# Altium footprint library Minh_Lib.PcbLib: 141 footprints (part 6 of 9)
Each footprint in its own frame and in the unit in brackets; x right, y up, seen from the top. Pads: shape width x height; smd on the part's side, far side on the other; paste and mask are expansions set on the pad; w line width, h text height; cw(c..) or ccw(c..) is an arc to the next point about the centre after c.
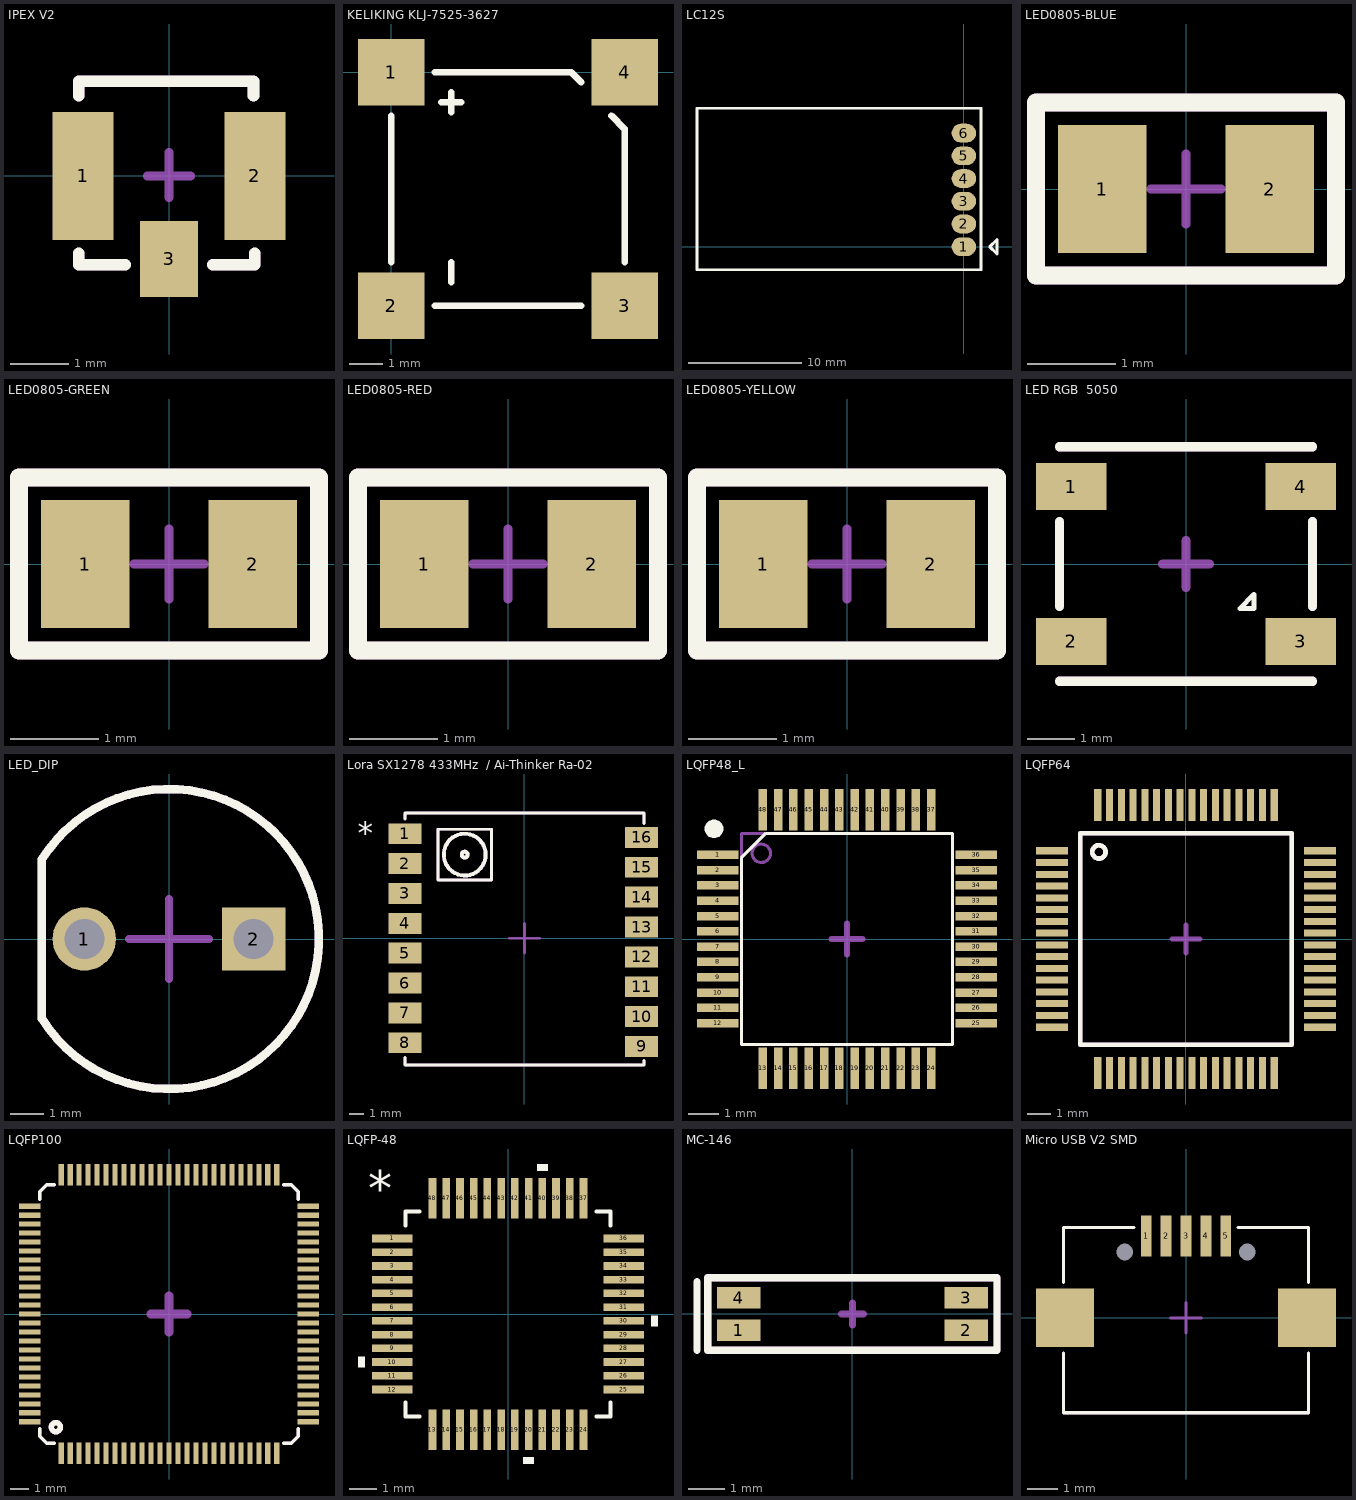
[diagram p5: the footprints below, top view; thin cyan lines are the x and y axes]

## IPEX V2 [mm]
pads (3):
  rect 1.05x2.2 smd: 1(-1.475,0) 2(1.475,0)
  rect 1x1.3 smd: 3(0,-1.425)
Top Overlay:
  lines w0.2: -1.55,-1.325 -1.55,-1.525 -0.75,-1.525 ; -1.55,1.375 -1.55,1.625 1.45,1.625 1.45,1.375 ; 0.75,-1.525 1.475,-1.525 1.475,-1.325
Mechanical 13:
  lines w0.2: -1.55,-1.325 -1.55,-1.525 -0.75,-1.525 ; -1.55,1.375 -1.55,1.625 1.45,1.625 1.45,1.375 ; 0.75,-1.525 1.475,-1.525 1.475,-1.325
  text "'.Designator'" at -1.9,-0.733 h0.5
Mechanical 15:
  lines w0.15: -0.375,0 0.025,0 ; -0.025,0 0.375,0 ; 0,-0.375 0,0.025 ; 0,0 0,0.4
3D body "User Library-IPEX.STEP": height 1.25, standoff -0.01, extent -1.525,-1.525 1.475,1.575

## KELIKING KLJ-7525-3627 [mm] "Buzzer SMD - 7.5x7.5x2.5mm 2700Hz 85dB"
pads (4):
  rect 2x2 smd: 1(0,0) 2(0,-7) 3(7,-7) 4(7,0)
Top Overlay:
  lines w0.2: 0,-5.7 0,-1.3 ; 1.3,-7 5.7,-7 ; 1.3,0 5.3,0 5.4,0 5.7,-0.3 ; 1.5,-0.9 1.8,-0.9 ; 1.8,-6.3 1.8,-6 1.8,-5.7 ; 1.8,-1.2 1.8,-0.9 ; 1.8,-0.6 1.8,-0.9 ; 2.1,-0.9 1.8,-0.9 ; 6.6,-1.3 7,-1.7 ; 7,-5.7 7,-1.7 ; 7,-1.7 7,-1.7
3D body "Buzzer KELIKING KLJ-7525-3627.STEP": height 2.65, standoff 0.05, extent -0.25,-7.25 7.25,0.25

## LC12S [mil]
pads (6):
  oval 85x65 smd: 1(0,0) 2(0,78.74) 3(0,157.48) 4(0,236.22) 5(0,314.96) 6(0,393.7)
Top Overlay:
  lines w10: -925,-80 60,-80 60,480 -925,480 -925,-80 ; 90,0 115,-25 115,25 90,0
3D body "LC12S.STEP": height 78.74, standoff 0, extent -912.32,-69.69 5,469.69

## LED0805-BLUE [mm]
pads (2):
  rect 1x1.45 smd: 1(-0.95,0) 2(0.95,0)
Top Overlay:
  lines w0.2: -1.7,-0.98 1.7,-0.98 1.7,0.98 -1.7,0.98 -1.7,-0.98
Mechanical 13:
  lines w0.2: -1.7,-0.98 1.7,-0.98 1.7,0.98 -1.7,0.98 -1.7,-0.98
  text "'.Designator'" at -1.59,-0.647 h0.7
Mechanical 15:
  lines w0.1: -0.4,0 0.4,0 ; 0,-0.4 0,0.4
3D body "SMD_0805LED_BLU.STEP": height 1.1, standoff 0, extent -1.01,-0.625 1.01,0.625

## LED0805-GREEN [mm]
pads (2):
  rect 1x1.45 smd: 1(-0.95,0) 2(0.95,0)
Top Overlay:
  lines w0.2: -1.7,-0.98 1.7,-0.98 1.7,0.98 -1.7,0.98 -1.7,-0.98
Mechanical 13:
  lines w0.2: -1.7,-0.98 1.7,-0.98 1.7,0.98 -1.7,0.98 -1.7,-0.98
  text "'.Designator'" at -1.59,-0.647 h0.7
Mechanical 15:
  lines w0.1: -0.4,0 0.4,0 ; 0,-0.4 0,0.4
3D body "SMD_0805LED_GREEN.STEP": height 1.1, standoff 0, extent -1.01,-0.625 1.01,0.625

## LED0805-RED [mm]
pads (2):
  rect 1x1.45 smd: 1(-0.95,0) 2(0.95,0)
Top Overlay:
  lines w0.2: -1.7,-0.98 -1.7,0.98 1.7,0.98 1.7,-0.98 -1.7,-0.98
Mechanical 13:
  lines w0.2: -1.7,-0.98 -1.7,0.98 1.7,0.98 1.7,-0.98 -1.7,-0.98
  text "'.Designator'" at -1.59,-0.647 h0.7
Mechanical 15:
  lines w0.1: -0.4,0 0.4,0 ; 0,-0.4 0,0.4
3D body "SMD_0805LED_RED.STEP": height 1.1, standoff 0, extent -1.01,-0.625 1.01,0.625

## LED0805-YELLOW [mm]
pads (2):
  rect 1x1.45 smd: 1(-0.95,0) 2(0.95,0)
Top Overlay:
  lines w0.2: -1.7,-0.98 -1.7,0.98 1.7,0.98 1.7,-0.98 -1.7,-0.98
Mechanical 13:
  lines w0.2: -1.7,-0.98 -1.7,0.98 1.7,0.98 1.7,-0.98 -1.7,-0.98
  text "'.Designator'" at -1.59,-0.647 h0.7
Mechanical 15:
  lines w0.1: -0.4,0 0.4,0 ; 0,-0.4 0,0.4
3D body "SMD_0805LED_YEL.STEP": height 1.1, standoff 0, extent -1.01,-0.625 1.01,0.625

## LED RGB  5050 [mm]
pads (4):
  rect 1.5x1 smd: 1(-2.45,1.65) 2(-2.45,-1.65) 3(2.45,-1.65) 4(2.45,1.65)
Top Overlay:
  lines w0.1: 1.45,-0.95 1.15,-0.95 1.45,-0.65 1.45,-0.95 ; 1.45,-0.95 1.45,-0.95
  lines w0.2: -2.7,-2.5 2.7,-2.5 ; -2.7,-0.9 -2.7,0.9 ; -2.7,2.5 2.7,2.5 ; 2.7,-0.9 2.7,0.9
Mechanical 13:
  lines w0.2: -2.7,-2.5 2.7,-2.5 ; -2.7,-0.9 -2.7,0.9 ; -2.7,2.5 2.7,2.5 ; 2.7,-0.9 2.7,0.9
  text "'.Designator'" at -2.6,-2.167 h0.7
Mechanical 15:
  lines w0.2: -0.5,0 0,0 ; 0,-0.5 0,0 ; 0,0.5 0,0 ; 0.5,0 0,0
3D body "User Library-ws2812B-1.step": height 1.55, standoff -0.02, extent -2.7,-2.5 2.7,2.5

## LED_DIP [mm]
pads (2):
  round 1.9 hole 1.2: 1(-2.54,0)
  rect 1.9x1.9 hole 1.2: 2(2.54,0)
Top Overlay:
  lines w0.254: -3.813,-2.39 ccw(c0,0) -3.811,2.393 -3.811,-2.39
Mechanical 13:
  lines w0.254: -3.813,-2.39 ccw(c0,0) -3.811,2.393 -3.811,-2.39
Mechanical 15:
  lines w0.254: -1.2,0 0,0 ; 0,-1.2 0,0 ; 0,1.2 0,0 ; 1.2,0 0,0
3D body "CircuitWorks-REDLED.step": height 5.38, standoff -3.17, extent -1.924,-1.698 2.064,1.794

## Lora SX1278 433MHz  / Ai-Thinker Ra-02 [mm] "415MHZ"
pads (16):
  rect 2.2x1.4 smd: 1(-8,7) 2(-8,5) 3(-8,3) 4(-8,1) 5(-8,-1) 6(-8,-3) 7(-8,-5) 8(-8,-7) 9(7.844,-7.247) 10(7.844,-5.247) 11(7.844,-3.247) 12(7.844,-1.247) 13(7.844,0.753) 14(7.844,2.753) 15(7.844,4.753) 16(7.844,6.753)
Top Overlay:
  circle w0.254: c-4,5.6 r0.2
  circle w0.254: c-4,5.6 r1.4
  lines w0.2: -8,-8 -8,-8.5 8,-8.5 8,-8.2 ; -8,8 -8,8.4 8,8.4 8,7.7 ; -5.8,3.9 -2.2,3.9 -2.2,7.3 -5.8,7.3 -5.8,3.9
  text "*" at -11.146,6.3 h1.52
Mechanical 13:
  circle w0.254: c-4,5.6 r0.2
  circle w0.254: c-4,5.6 r1.4
  lines w0.2: -8,-8 -8,-8.5 8,-8.5 8,-8.2 ; -8,8 -8,8.4 8,8.4 8,7.7 ; -5.8,3.9 -2.2,3.9 -2.2,7.3 -5.8,7.3 -5.8,3.9
  text "*" at -11.146,6.3 h1.52
Mechanical 15:
  lines w0.2: -1,0 0,0 ; 0,-1 0,0 ; 0,1 0,0 ; 1,0 0,0
3D body "LoRa_Module_RA-02_AiThinker.step": height 3.13, standoff 0.1, extent -8,-8.6 8,8.4

## LQFP48_L [mm] "Thin QFP, 48-Leads, Body 7x7mm, Pitch 0.5mm, IPC High Density"
height 1.6
pads (48):
  rect 1.35x0.279 smd: 1(-4.225,2.75) 2(-4.225,2.25) 3(-4.225,1.75) 4(-4.225,1.25) 5(-4.225,0.75) 6(-4.225,0.25) 7(-4.225,-0.25) 8(-4.225,-0.75) 9(-4.225,-1.25) 10(-4.225,-1.75) 11(-4.225,-2.25) 12(-4.225,-2.75) 25(4.225,-2.75) 26(4.225,-2.25) 27(4.225,-1.75) 28(4.225,-1.25) 29(4.225,-0.75) 30(4.225,-0.25) 31(4.225,0.25) 32(4.225,0.75) 33(4.225,1.25) 34(4.225,1.75) 35(4.225,2.25) 36(4.225,2.75)
  rect 0.279x1.35 smd: 13(-2.75,-4.225) 14(-2.25,-4.225) 15(-1.75,-4.225) 16(-1.25,-4.225) 17(-0.75,-4.225) 18(-0.25,-4.225) 19(0.25,-4.225) 20(0.75,-4.225) 21(1.25,-4.225) 22(1.75,-4.225) 23(2.25,-4.225) 24(2.75,-4.225) 37(2.75,4.225) 38(2.25,4.225) 39(1.75,4.225) 40(1.25,4.225) 41(0.75,4.225) 42(0.25,4.225) 43(-0.25,4.225) 44(-0.75,4.225) 45(-1.25,4.225) 46(-1.75,4.225) 47(-2.25,4.225) 48(-2.75,4.225)
Top Overlay:
  region: -4.35,3.3 -4.41,3.3 -4.52,3.346 -4.604,3.43 -4.65,3.54 -4.65,3.6 -4.65,3.66 -4.604,3.77 -4.52,3.854 -4.41,3.9 -4.35,3.9 -4.29,3.9 -4.18,3.854 -4.096,3.77 -4.05,3.66 -4.05,3.6 -4.05,3.54 -4.096,3.43 -4.18,3.346 -4.29,3.3
  lines w0.1: -3.45,-3.45 -3.45,2.65 -2.65,3.45 3.45,3.45 3.45,-3.45 -3.45,-3.45
Mechanical 13:
  circle w0.1: c-2.8,2.8 r0.3
  lines w0.1: -3.45,-3.45 -3.45,3.45 3.45,3.45 3.45,-3.45 -3.45,-3.45
  text "'.Designator'" at -4.25,-2.683 h0.8
Mechanical 15:
  lines w0.2: -0.5,0 0.5,0 ; 0,-0.5 0,0.5
3D body "User Library-LQFP48-0_5.STEP": height 1.6, standoff 0.03, extent -4.392,-4.382 4.38,4.39

## LQFP64 [mm]
pads (64):
  rect 1.35x0.3 smd: 1(-5.7,3.75) 2(-5.7,3.25) 3(-5.7,2.75) 4(-5.7,2.25) 5(-5.7,1.75) 6(-5.7,1.25) 7(-5.7,0.75) 8(-5.7,0.25) 9(-5.7,-0.25) 10(-5.7,-0.75) 11(-5.7,-1.25) 12(-5.7,-1.75) 13(-5.7,-2.25) 14(-5.7,-2.75) 15(-5.7,-3.25) 16(-5.7,-3.75) 33(5.7,-3.75) 34(5.7,-3.25) 35(5.7,-2.75) 36(5.7,-2.25) 37(5.7,-1.75) 38(5.7,-1.25) 39(5.7,-0.75) 40(5.7,-0.25) 41(5.7,0.25) 42(5.7,0.75) 43(5.7,1.25) 44(5.7,1.75) 45(5.7,2.25) 46(5.7,2.75) 47(5.7,3.25) 48(5.7,3.75)
  rect 0.3x1.35 smd: 17(-3.75,-5.7) 18(-3.25,-5.7) 19(-2.75,-5.7) 20(-2.25,-5.7) 21(-1.75,-5.7) 22(-1.25,-5.7) 23(-0.75,-5.7) 24(-0.25,-5.7) 25(0.25,-5.7) 26(0.75,-5.7) 27(1.25,-5.7) 28(1.75,-5.7) 29(2.25,-5.7) 30(2.75,-5.7) 31(3.25,-5.7) 32(3.75,-5.7) 49(3.75,5.7) 50(3.25,5.7) 51(2.75,5.7) 52(2.25,5.7) 53(1.75,5.7) 54(1.25,5.7) 55(0.75,5.7) 56(0.25,5.7) 57(-0.25,5.7) 58(-0.75,5.7) 59(-1.25,5.7) 60(-1.75,5.7) 61(-2.25,5.7) 62(-2.75,5.7) 63(-3.25,5.7) 64(-3.75,5.7)
Top Overlay:
  circle w0.2: c-3.7,3.7 r0.283
  lines w0.2: -4.5,-4.5 -4.5,3.4 -4.5,4.5 4.5,4.5 4.5,-4.5 -4.5,-4.5
Mechanical 13:
  circle w0.2: c-3.7,3.7 r0.283
  lines w0.2: -4.5,-4.5 -4.5,3.4 -4.5,4.5 4.5,4.5 4.5,-4.5 -4.5,-4.5
  text "'.Designator'" at -4.3,-3.8 h1.5
Mechanical 15:
  lines w0.2: -0.6,0 0,0 ; 0,-0.6 0,0 ; 0,0.6 0,0 ; 0.6,0 0,0
3D body "User Library-STM32Fxxx -LQFP64 10mm x 10mm.step": height 1.6, standoff 0.01, extent -5.999,-5.999 5.999,5.999

## LQFP100 [mm] "LQFP100"
pads (100):
  rect 0.285x1.2 smd: 1(-6,-7.75) 2(-5.5,-7.75) 3(-5,-7.75) 4(-4.5,-7.75) 5(-4,-7.75) 6(-3.5,-7.75) 7(-3,-7.75) 8(-2.5,-7.75) 9(-2,-7.75) 10(-1.5,-7.75) 11(-1,-7.75) 12(-0.5,-7.75) 13(0,-7.75) 14(0.5,-7.75) 15(1,-7.75) 16(1.5,-7.75) 17(2,-7.75) 18(2.5,-7.75) 19(3,-7.75) 20(3.5,-7.75) 21(4,-7.75) 22(4.5,-7.75) 23(5,-7.75) 24(5.5,-7.75) 25(6,-7.75) 51(6,7.75) 52(5.5,7.75) 53(5,7.75) 54(4.5,7.75) 55(4,7.75) 56(3.5,7.75) 57(3,7.75) 58(2.5,7.75) 59(2,7.75) 60(1.5,7.75) 61(1,7.75) 62(0.5,7.75) 63(0,7.75) 64(-0.5,7.75) 65(-1,7.75) 66(-1.5,7.75) 67(-2,7.75) 68(-2.5,7.75) 69(-3,7.75) 70(-3.5,7.75) 71(-4,7.75) 72(-4.5,7.75) 73(-5,7.75) 74(-5.5,7.75) 75(-6,7.75)
  rect 1.2x0.285 smd: 26(7.75,-6) 27(7.75,-5.5) 28(7.75,-5) 29(7.75,-4.5) 30(7.75,-4) 31(7.75,-3.5) 32(7.75,-3) 33(7.75,-2.5) 34(7.75,-2) 35(7.75,-1.5) 36(7.75,-1) 37(7.75,-0.5) 38(7.75,0) 39(7.75,0.5) 40(7.75,1) 41(7.75,1.5) 42(7.75,2) 43(7.75,2.5) 44(7.75,3) 45(7.75,3.5) 46(7.75,4) 47(7.75,4.5) 48(7.75,5) 49(7.75,5.5) 50(7.75,6) 76(-7.75,6) 77(-7.75,5.5) 78(-7.75,5) 79(-7.75,4.5) 80(-7.75,4) 81(-7.75,3.5) 82(-7.75,3) 83(-7.75,2.5) 84(-7.75,2) 85(-7.75,1.5) 86(-7.75,1) 87(-7.75,0.5) 88(-7.75,0) 89(-7.75,-0.5) 90(-7.75,-1) 91(-7.75,-1.5) 92(-7.75,-2) 93(-7.75,-2.5) 94(-7.75,-3) 95(-7.75,-3.5) 96(-7.75,-4) 97(-7.75,-4.5) 98(-7.75,-5) 99(-7.75,-5.5) 100(-7.75,-6)
Top Overlay:
  circle w0.3: c-6.3,-6.3 r0.25
  lines w0.2: -7.2,-6.4 -7.2,-6.8 -6.8,-7.2 -6.4,-7.2 ; -7.2,6.4 -7.2,6.8 -6.8,7.2 -6.4,7.2 ; 6.4,-7.2 6.8,-7.2 7.2,-6.8 7.2,-6.4 ; 6.4,7.2 6.8,7.2 7.2,6.8 7.2,6.4
Mechanical 13:
  text "'.Designator'" at -6.1,-5.7 h1.5
Mechanical 15:
  circle w0.3: c-6.3,-6.3 r0.25
  lines w0.2: -7.2,-6.4 -7.2,-6.8 -6.8,-7.2 -6.4,-7.2 ; -7.2,6.4 -7.2,6.8 -6.8,7.2 -6.4,7.2 ; 6.4,-7.2 6.8,-7.2 7.2,-6.8 7.2,-6.4 ; 6.4,7.2 6.8,7.2 7.2,6.8 7.2,6.4
  lines w0.5: -1,0 0,0 ; 0,-1 0,0 ; 0,1 0,0 ; 1,0 0,0
3D body "STM32F411-LQFP100.step": height 1.6, standoff 0, extent -8.003,-8.003 8.003,8.003

## LQFP-48 [mil]
pads (48):
  rect 58x11 smd: 1(-166,108.27) 2(-166,88.58) 3(-166,68.9) 4(-166,49.21) 5(-166,29.53) 6(-166,9.84) 7(-166,-9.84) 8(-166,-29.53) 9(-166,-49.21) 10(-166,-68.9) 11(-166,-88.58) 12(-166,-108.27) 25(166,-108.27) 26(166,-88.58) 27(166,-68.9) 28(166,-49.21) 29(166,-29.53) 30(166,-9.84) 31(166,9.84) 32(166,29.53) 33(166,49.21) 34(166,68.9) 35(166,88.58) 36(166,108.27)
  rect 11x58 smd: 13(-108.27,-166) 14(-88.58,-166) 15(-68.9,-166) 16(-49.21,-166) 17(-29.53,-166) 18(-9.84,-166) 19(9.84,-166) 20(29.53,-166) 21(49.21,-166) 22(68.9,-166) 23(88.58,-166) 24(108.27,-166) 37(108.27,166) 38(88.58,166) 39(68.9,166) 40(49.21,166) 41(29.53,166) 42(9.84,166) 43(-9.84,166) 44(-29.53,166) 45(-49.21,166) 46(-68.9,166) 47(-88.58,166) 48(-108.27,166)
Top Overlay:
  region: -205,-61.4 -215,-61.4 -215,-76.4 -205,-76.4
  region: 37.03,-205 22.03,-205 22.03,-215 37.03,-215
  region: 205,-2.34 215,-2.34 215,-17.34 205,-17.34
  region: 56.71,205 41.71,205 41.71,215 56.71,215
  lines w6: -147,-126.87 -147,-147 -126.87,-147 ; -147,126.87 -147,147 -126.87,147 ; 126.87,-147 147,-147 147,-126.87 ; 126.87,147 147,147 147,126.87
  text "*" at -200,155 h50
Mechanical 13:
  text "'.Designator'" at -137.8,-119.43 h43.31
3D body "LQFP-48.step": height 63.11, standoff 0, extent -180.98,-180.99 180.99,180.99
3D body: height 10, standoff 0, extent 0,0 10,10

## MC-146 [mm] "Thach Anh 32.768KHz"
pads (4):
  rect 1.2x0.6 smd: 1(-3.15,-0.45) 2(3.15,-0.45) 3(3.15,0.45) 4(-3.15,0.45)
Top Overlay:
  lines w0.2: -4.3,-1 -4.3,0.9 ; -4,-1 4,-1 4,1 -4,1 -4,-1
Mechanical 13:
  lines w0.2: -4,-1 4,-1 4,1 -4,1 -4,-1
  text "'.Designator'" at -3.925,-0.558 h0.8
Mechanical 15:
  lines w0.2: -0.3,0 0,0 ; 0,-0.3 0,0 ; 0,0.3 0,0 ; 0.3,0 0,0
3D body "User Library-CSYTAL-MC146.step": height 1.4, standoff 0, extent -3.45,-0.75 3.45,0.75

## Micro USB V2 SMD [mm]
pads (9):
  rect 0.35x1.35 smd: 1(-1.3,2.675) 2(-0.65,2.675) 3(0,2.675) 4(0.65,2.675) 5(1.3,2.675)
  rect 1.9x1.9 smd: ""(-3.95,0) ""(3.95,0)
  round 0.4 hole 0.55: ""(-2,2.15) ""(2,2.15)
Top Overlay:
  lines w0.1: -4,-1.15 -4,-3.1 4,-3.1 4,-1.15 ; -4,1.15 -4,2.95 -1.7,2.95 ; 1.7,2.95 4,2.95 4,1.15
Mechanical 13:
  lines w0.1: -4,-1.15 -4,-3.1 4,-3.1 4,-1.15 ; -4,1.15 -4,2.95 -1.7,2.95 ; 1.7,2.95 4,2.95 4,1.15
  text "'.Designator'" at -3.475,-2.158 h0.8
Mechanical 15:
  lines w0.1: -0.5,0 0,0 ; 0,-0.5 0,0 ; 0,0.5 0,0 ; 0.5,0 0,0
3D body "65944.stp": height 2.7, standoff -0.6, extent -4,-3.094 4,2.95